# Altium footprint library myPCBLib.PcbLib: 113 footprints (part 4 of 8)
Each footprint in its own frame and in the unit in brackets; x right, y up, seen from the top. Pads: shape width x height; smd on the part's side, far side on the other; paste and mask are expansions set on the pad; w line width, h text height; cw(c..) or ccw(c..) is an arc to the next point about the centre after c.
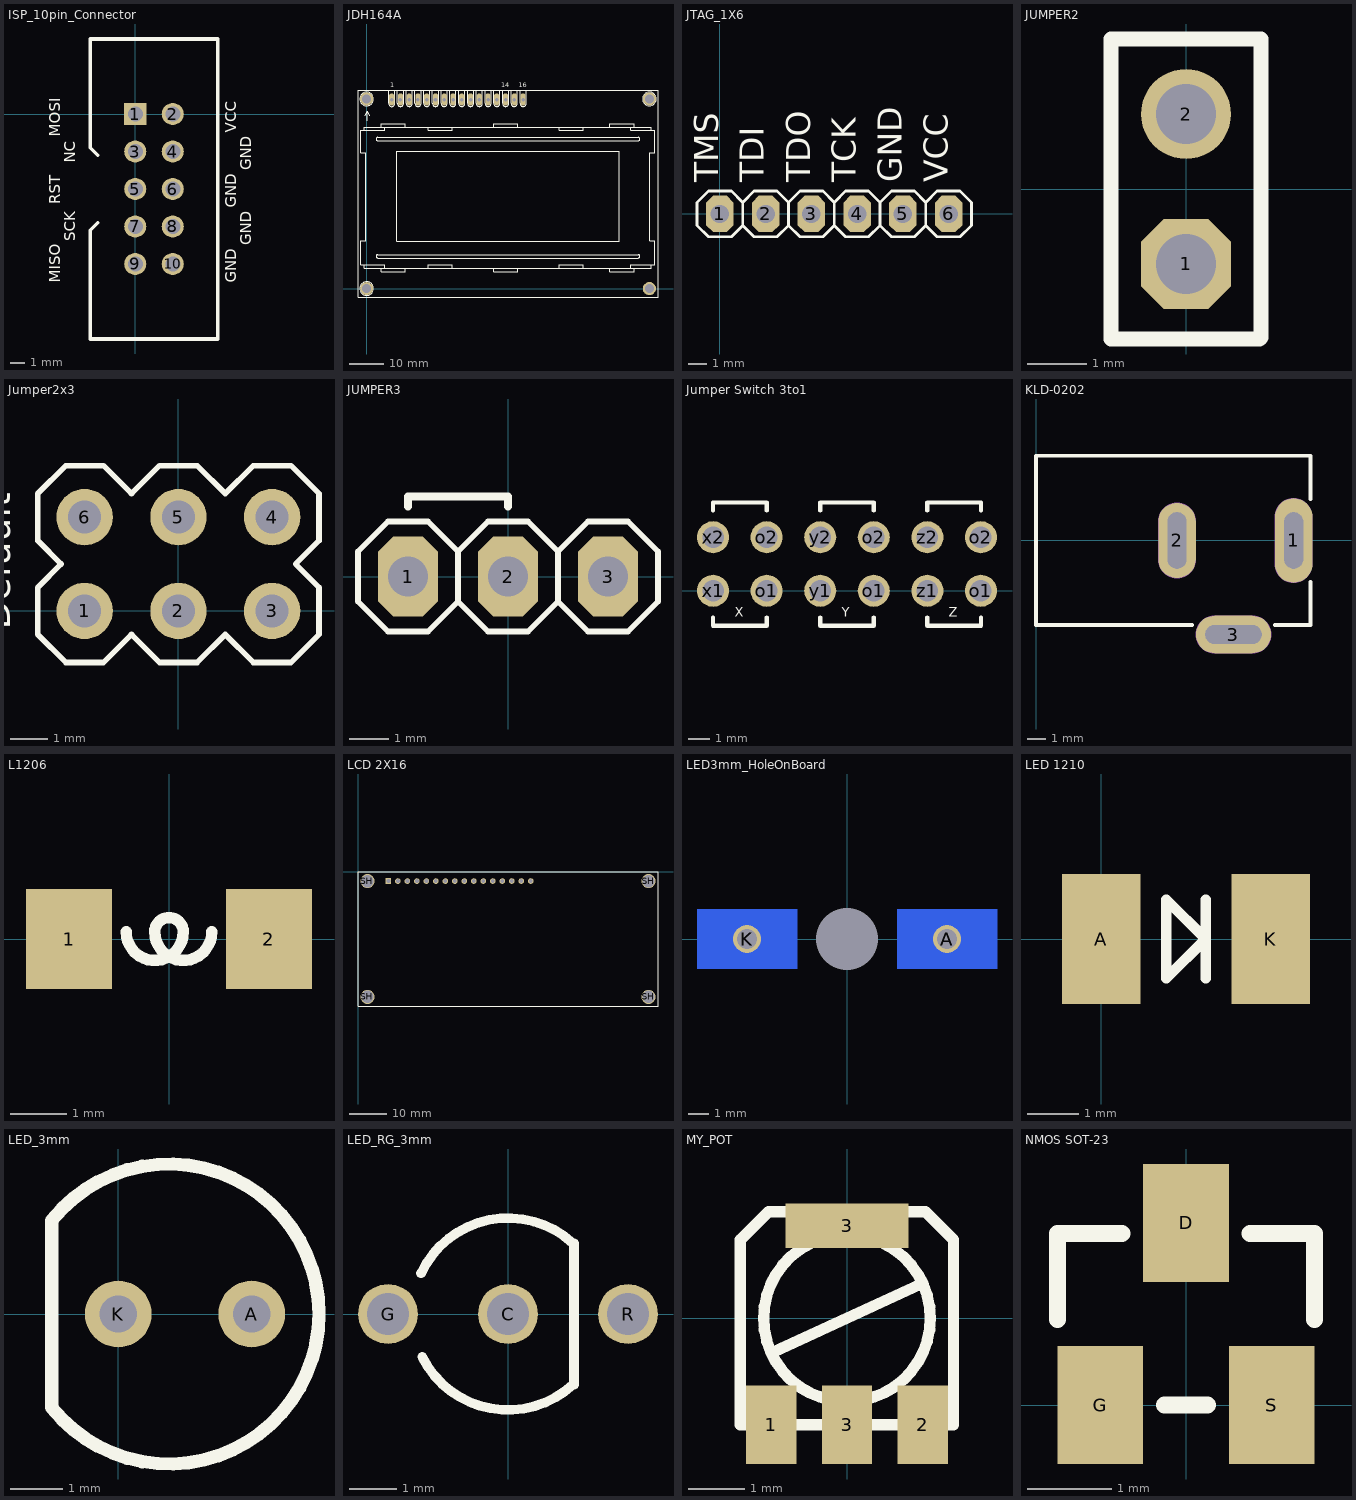
[diagram p3: the footprints below, top view; thin cyan lines are the x and y axes]

## ISP_10pin_Connector [mm]
pads (10):
  rect 1.5x1.5 hole 1.016: 1(0,0)
  round 1.5 hole 1.016: 2(2.54,0) 3(0,-2.54) 4(2.54,-2.54) 5(0,-5.08) 6(2.54,-5.08) 7(0,-7.62) 8(2.54,-7.62) 9(0,-10.16) 10(2.54,-10.16)
Top Overlay:
  lines w0.254: -2.54,-7.366 -3.048,-7.874 -3.048,-15.24 5.588,-15.24 5.588,5.08 -3.048,5.08 -3.048,-2.286 -2.54,-2.794
  text "NC" at -3.81,-3.302 h1.27
  text "GND" at 7.112,-11.43 h1.27
  text "GND" at 8.128,-8.89 h1.27
  text "GND" at 7.112,-6.35 h1.27
  text "GND" at 8.128,-3.81 h1.27
  text "VCC" at 7.112,-1.27 h1.27
  text "MISO" at -4.826,-11.43 h1.27
  text "SCK" at -3.81,-8.636 h1.27
  text "RST" at -4.826,-6.096 h1.27
  text "MOSI" at -4.826,-1.524 h1.27
3D body: height 8.8, standoff -3, extent -3.176,-15.12 6.224,5.08

## JDH164A [mil]
pads (20):
  oct 60x140 hole 40: 1(286.42,2159.45) 2(386.42,2159.45) 3(486.42,2159.45) 4(586.42,2159.45) 5(686.42,2159.45) 6(786.42,2159.45) 7(886.42,2159.45) 8(986.42,2159.45) 9(1086.42,2159.45) 10(1186.42,2159.45) 11(1286.42,2159.45) 12(1386.42,2159.45) 13(1486.42,2159.45) 14(1586.42,2159.45) 15(1686.42,2159.45) 16(1786.42,2159.45)
  round 149.61 hole 100: P$1(0,0.98)
  round 151.18 hole 100: P$2(0,2166.34) P$3(3228.35,2166.34) P$4(3228.35,0.98)
Top Overlay:
  drawing of 155 lines, arcs and shapes, not listed
  text "14" at 1536.92,2284.45 h90
  text "16" at 1736.92,2284.45 h90
  text "1" at 271.92,2284.45 h90
3D body: height 435.04, standoff -53.15, extent -100,-100 3325.2,2262.2
3D body: height 366.14, standoff -122.05, extent -98.43,-98.43 3326.77,2263.78

## JTAG_1X6 [mil]
pads (6):
  oct 60x80 hole 40: 1(0,0) 2(100,0) 3(200,0) 4(300,0) 5(400,0) 6(500,0)
Top Overlay:
  rectangle: 489.95,-10 509.95,10
  rectangle: -10.05,-10 9.95,10
  rectangle: 89.95,-10 109.95,10
  rectangle: 189.95,-10 209.95,10
  rectangle: 289.95,-10 309.95,10
  rectangle: 389.95,-10 409.95,10
  lines w6: 50,-25 75,-50 125,-50 150,-25 ; 50,-25 25,-50 -25,-50 -50,-25 -50,25 -25,50 25,50 50,25 ; 50,-25 50,25 ; 50,25 75,50 125,50 150,25 ; 150,-25 150,25 ; 150,-25 175,-50 225,-50 250,-25 ; 150,25 175,50 225,50 250,25 ; 250,-25 275,-50 325,-50 350,-25 ; 250,-25 250,25 ; 250,25 275,50 325,50 350,25 ; 350,-25 375,-50 425,-50 450,-25 ; 350,-25 350,25 ; 350,25 375,50 425,50 450,25 ; 450,-25 475,-50 525,-50 550,-25 550,25 525,50 475,50 450,25 ; 450,-25 450,25
  text "TMS" at 13.78,68.84 h90
  text "TDI" at 113.53,68.84 h90
  text "TDO" at 214.57,68.84 h90
  text "TCK" at 314.96,68.84 h90
  text "GND" at 415.35,68.84 h90
  text "VCC" at 515.75,68.9 h90

## JUMPER2 [mil]
pads (2):
  oct 60x60 hole 40: 1(0,-50)
  round 60 hole 40: 2(0,50)
Top Overlay:
  lines w10: -50,-100 49,-100 50,-99 50,0 50,100 -50,100 -50,-100
3D body: height 404.72, standoff 150, extent -46.06,-98.03 50,98.03
3D body: height 98.11, standoff -390.08, extent -53.28,-95 45,105

## Jumper2x3 [mil]
pads (6):
  round 60 hole 35: 1(-100,0) 2(0,0) 3(100,0) 4(100,100) 5(0,100) 6(-100,100)
Top Overlay:
  lines w6: -150,-25 -120,-55 -80,-55 -50,-25 -20,-55 20,-55 50,-25 80,-55 120,-55 150,-25 150,25 125,50 150,75 150,125 120,155 80,155 50,125 20,155 -20,155 -50,125 -80,155 -120,155 -150,125 -150,75 -125,50 -150,25 -150,-25
  text "Default" at -170,-20 h50
3D body: height 370.08, standoff -118.11, extent -155,50 145,148.28
3D body: height 404.72, standoff 150, extent -150,53.93 46.06,150
3D body: height 370.08, standoff -118.11, extent -155,-50 145,48.28
3D body: height 404.72, standoff 150, extent -150,-46.07 46.06,50

## JUMPER3 [mil]
height 393.7
pads (3):
  oct 60x80 hole 40: 1(-100,0) 2(0,0) 3(100,0)
Top Overlay:
  lines w6: -50,-25 -50,25 ; -50,-25 -80,-55 -120,-55 -150,-25 -150,25 -120,55 -80,55 -50,25 ; -50,-25 -20,-55 20,-55 50,-25 ; -50,25 -20,55 20,55 50,25 ; 50,-25 50,25 ; 50,-25 80,-55 120,-55 150,-25 150,25 120,55 80,55 50,25
  lines w8: -100,70 -100,80 0,80 0,70
3D body: height 370.08, standoff -118.11, extent -145,-48.28 155,50
3D body: height 404.72, standoff 150, extent -146.06,-45 50,51.06

## Jumper Switch 3to1 [mil]
pads (12):
  round 60 hole 40: o1(200,0) o1(400,0) o1(600,0) o2(200,100) o2(400,100) o2(600,100) x1(100,0) x2(100,100) y1(300,0) y2(300,100) z1(500,0) z2(500,100)
Top Overlay:
  lines w8: 100,-50 100,-65 200,-65 200,-50 ; 100,150 100,165 200,165 200,150 ; 300,-50 300,-65 400,-65 400,-50 ; 300,150 300,165 400,165 400,150 ; 500,-50 500,-65 600,-65 600,-50 ; 500,150 500,165 600,165 600,150
  text "X" at 140,-55 h30
  text "Y" at 340,-55 h30
  text "Z" at 540,-55 h30

## KLD-0202 [mm]
pads (3):
  oval 2x4.5 hole 1 slot 3 at 90 deg: 1(13.7,0)
  oval 2x4 hole 1 slot 3 at 90 deg: 2(7.5,0)
  oval 4x2 hole 1 slot 3 at 0 deg: 3(10.5,-5)
Top Overlay:
  lines w0.2: 8.3,-4.5 0,-4.5 0,4.5 14.6,4.5 14.6,2.2 ; 12.7,-4.5 14.6,-4.5 14.6,-2.2
Mechanical 1:
  lines w1: 7.5,-1 7.5,1 ; 9.5,-5 11.5,-5 ; 13.7,-1.25 13.7,1.25
Mechanical 2:
  lines w2.016: 7.5,-1 7.5,1 ; 9.5,-5 11.5,-5 ; 13.7,-1.25 13.7,1.25

## L1206 [mil]
pads (2):
  rect 60x70 smd: 1(-70,0) 2(70,0)
Top Overlay:
  lines w8: -30,5 ccw(c-10,5) 10,5 ccw(c0,5) -10,5 ccw(c10,5) 30,5

## LCD 2X16 [mil]
pads (20):
  rect 60x60 hole 40: 1(320,-100)
  round 60 hole 40: 2(420,-100) 3(520,-100) 4(620,-100) 5(720,-100) 6(820,-100) 7(920,-100) 8(1020,-100) 9(1120,-100) 10(1220,-100) 11(1320,-100) 12(1420,-100) 13(1520,-100) 14(1620,-100) 15(1720,-100) 16(1820,-100)
  round 150 hole 129.92: SH(100,-1320) SH(100,-100) SH(3060,-1320) SH(3060,-100)
Top Overlay:
  lines w8: 0,-1420 3160,-1420 3160,0 0,0 0,-1420
3D body: height 505.12, standoff 33.07, extent 5.2,-1417.32 3154.8,0

## LED3mm_HoleOnBoard [mm]
pads (5):
  round 0 hole 3.1 unplated: 0(0,0)
  round 1.397 hole 1.016: A(5,0) K(-5,0)
  rect 5x3 smd far side: A(5,0) K(-5,0)

## LED 1210 [mil]
pads (2):
  rect 60x100 smd: A(0,0) K(130,0)
Top Overlay:
  lines w8: 80,-30 80,30 ; 50,-30 80,0 50,30 50,-30
  text "." at 180,40 h20

## LED_3mm [mil]
pads (2):
  round 50 hole 28: A(100,0) K(0,0)
Top Overlay:
  lines w10: -50,-70 ccw(c38,0) -50,70 -50,-70
3D body: height 255.91, standoff -78.74, extent -12.99,-74.8 124.8,74.81

## LED_RG_3mm [mil]
pads (3):
  round 50 hole 35: C(0,0) G(-100,0) R(100,0)
Top Overlay:
  lines w8: -72.49,33.83 cw(c0,0) 54.06,58.97 55,58.97 55,-58.97 ; -71.55,-35.78 ccw(c0,0) 54.06,-58.97

## MY_POT [mm]
pads (4):
  rect 0.9x1.4 smd: 1(-1.35,-1.9) 2(1.35,-1.9) 3(0,-1.9)
  rect 2.2x0.8 smd: 3(0,1.65)
Top Overlay:
  lines w0.203: -1.3,-0.6 1.3,0.6 ; -1.9,-1.9 -1.9,1.4 -1.4,1.9 1.4,1.9 1.9,1.4 1.9,-1.9 1.6,-1.9 1.6,-2.4 1.1,-2.4 1.1,-1.9 0.25,-1.9 0.25,-2.4 -0.25,-2.4 -0.25,-1.9 -1.1,-1.9 -1.1,-2.4 -1.6,-2.4 -1.6,-1.9 -1.9,-1.9 ; -1,-1.1 cw(c0,0) -1,1.1 cw(c0,0) 1,1.1 cw(c0,0) 1,-1.1 cw(c0,0) -1,-1.1

## NMOS SOT-23 [mil]
pads (3):
  rect 40x55 smd: D(0,85) G(-40,0) S(40,0)
Top Overlay:
  lines w8: -60,40 -60,80 -30,80 ; -10,0 10,0 ; 30,80 60,80 60,40